# Altium footprint library Package_DFN_QFN.PcbLib: 557 footprints (part 31 of 35)
Each footprint in its own frame and in the unit in brackets; x right, y up, seen from the top. Pads: shape width x height; smd on the part's side, far side on the other; paste and mask are expansions set on the pad; w line width, h text height; cw(c..) or ccw(c..) is an arc to the next point about the centre after c.
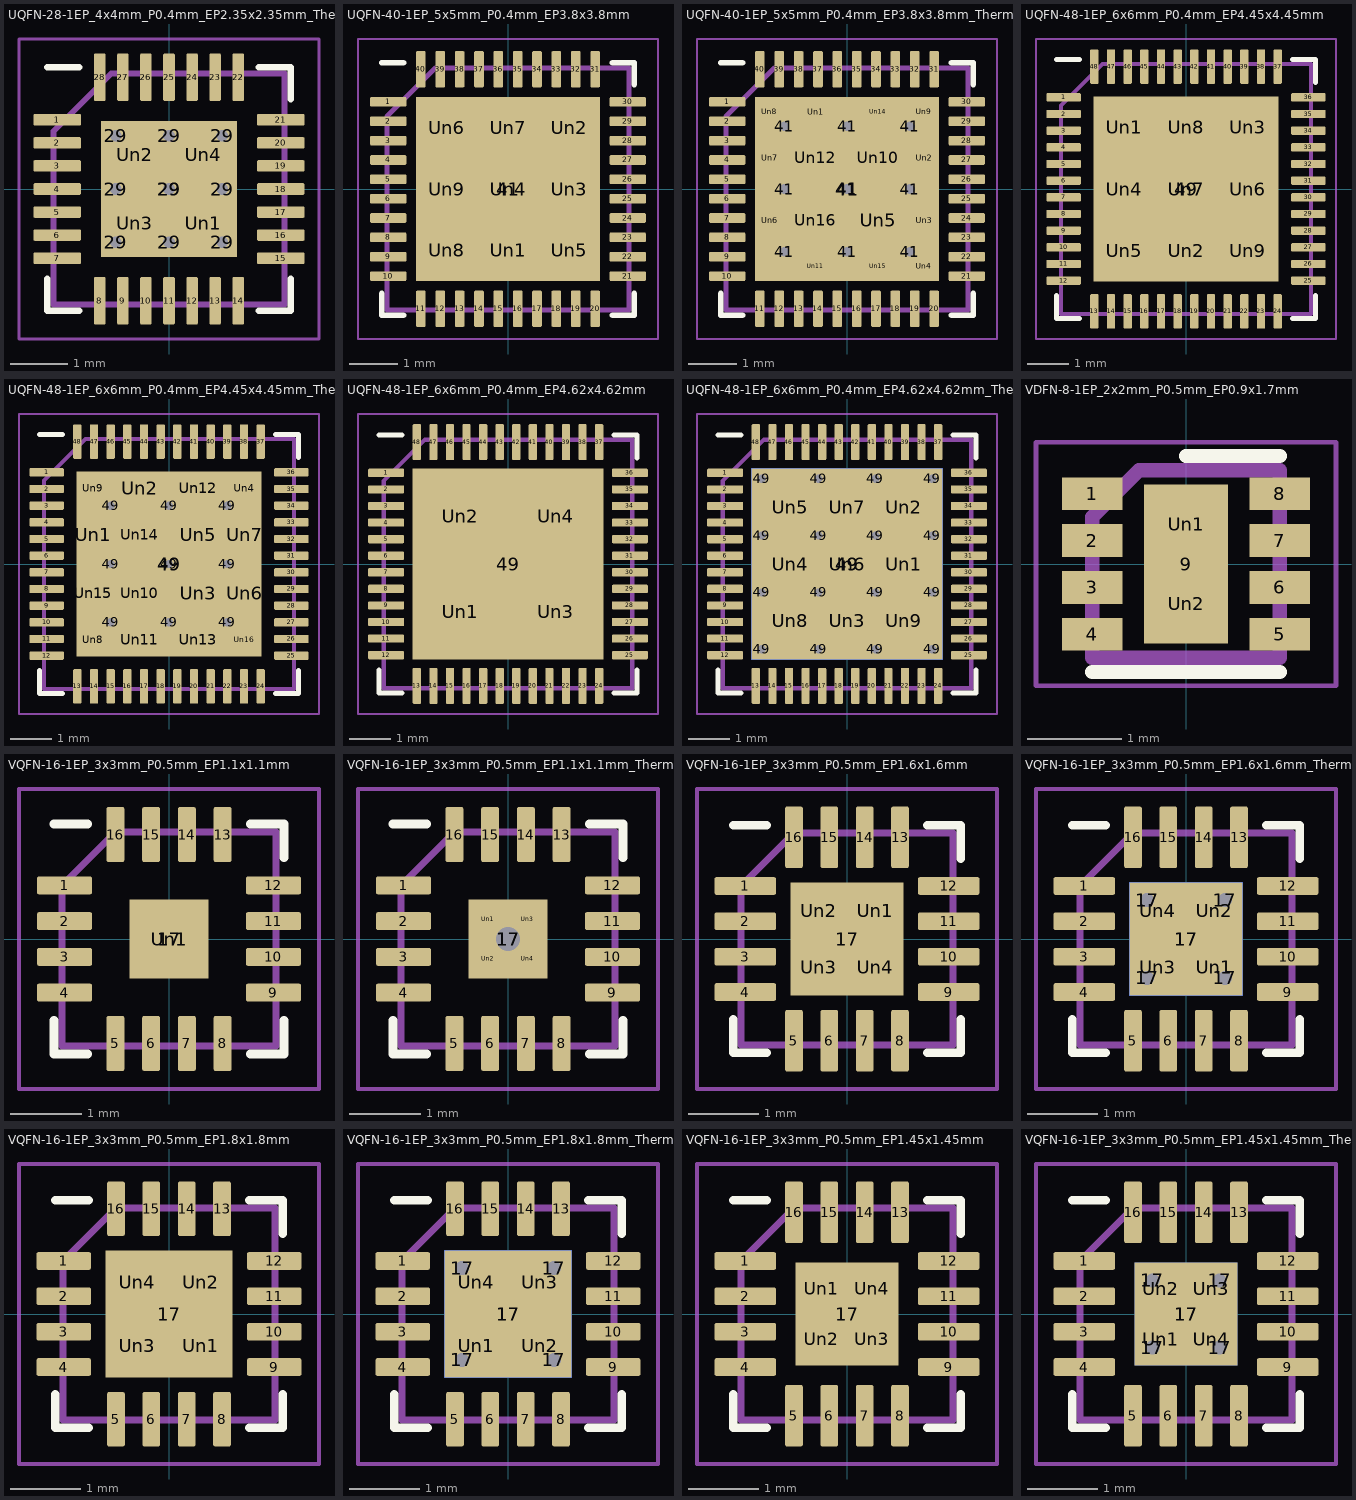
[diagram p30: the footprints below, top view; thin cyan lines are the x and y axes]

## UQFN-28-1EP_4x4mm_P0.4mm_EP2.35x2.35mm_ThermalVias [mm]
pads (43):
  rrect25% 0.825x0.2 smd: 1(-1.937,1.2) 2(-1.937,0.8) 3(-1.937,0.4) 4(-1.937,0) 5(-1.937,-0.4) 6(-1.937,-0.8) 7(-1.937,-1.2) 15(1.937,-1.2) 16(1.937,-0.8) 17(1.937,-0.4) 18(1.937,0) 19(1.937,0.4) 20(1.937,0.8) 21(1.937,1.2)
  rrect25% 0.2x0.825 smd: 8(-1.2,-1.937) 9(-0.8,-1.937) 10(-0.4,-1.937) 11(0,-1.937) 12(0.4,-1.937) 13(0.8,-1.937) 14(1.2,-1.937) 22(1.2,1.937) 23(0.8,1.937) 24(0.4,1.937) 25(0,1.937) 26(-0.4,1.937) 27(-0.8,1.937) 28(-1.2,1.937)
  round 0.5 hole 0.2: 29(-0.925,-0.925) 29(-0.925,0) 29(-0.925,0.925) 29(0,-0.925) 29(0,0) 29(0,0.925) 29(0.925,-0.925) 29(0.925,0) 29(0.925,0.925)
  rect 2.35x2.35 smd far side: 29(0,0)
  rect 2.35x2.35 smd: 29(0,0)
  rrect25% 0.98x0.98 on Top Paste: Un1(0.59,-0.59) Un2(-0.59,0.59) Un3(-0.59,-0.59) Un4(0.59,0.59)
F.SilkS:
  lines w0.12: -2.11,-1.56 -2.11,-2.11 -1.56,-2.11 ; -2.11,2.11 -1.56,2.11 ; 1.56,-2.11 2.11,-2.11 2.11,-1.56 ; 1.56,2.11 2.11,2.11 2.11,1.56
F.CrtYd:
  lines w0.05: -2.6,-2.6 2.6,-2.6 2.6,2.6 -2.6,2.6 -2.6,-2.6
F.Fab:
  lines w0.1: -2,-2 2,-2 2,2 -1,2 -2,1 -2,-2
  text "'.Designator'" at -4.047,-0.84 h1

## UQFN-40-1EP_5x5mm_P0.4mm_EP3.8x3.8mm [mm]
pads (50):
  rrect25% 0.75x0.2 smd: 1(-2.475,1.8) 2(-2.475,1.4) 3(-2.475,1) 4(-2.475,0.6) 5(-2.475,0.2) 6(-2.475,-0.2) 7(-2.475,-0.6) 8(-2.475,-1) 9(-2.475,-1.4) 10(-2.475,-1.8) 21(2.475,-1.8) 22(2.475,-1.4) 23(2.475,-1) 24(2.475,-0.6) 25(2.475,-0.2) 26(2.475,0.2) 27(2.475,0.6) 28(2.475,1) 29(2.475,1.4) 30(2.475,1.8)
  rrect25% 0.2x0.75 smd: 11(-1.8,-2.475) 12(-1.4,-2.475) 13(-1,-2.475) 14(-0.6,-2.475) 15(-0.2,-2.475) 16(0.2,-2.475) 17(0.6,-2.475) 18(1,-2.475) 19(1.4,-2.475) 20(1.8,-2.475) 31(1.8,2.475) 32(1.4,2.475) 33(1,2.475) 34(0.6,2.475) 35(0.2,2.475) 36(-0.2,2.475) 37(-0.6,2.475) 38(-1,2.475) 39(-1.4,2.475) 40(-1.8,2.475)
  rect 3.8x3.8 smd: 41(0,0)
  rrect25% 1.02x1.02 on Top Paste: Un1(0,-1.27) Un2(1.27,1.27) Un3(1.27,0) Un4(0,0) Un5(1.27,-1.27) Un6(-1.27,1.27) Un7(0,1.27) Un8(-1.27,-1.27) Un9(-1.27,0)
F.SilkS:
  lines w0.12: -2.61,-2.16 -2.61,-2.61 -2.16,-2.61 ; -2.61,2.61 -2.16,2.61 ; 2.16,-2.61 2.61,-2.61 2.61,-2.16 ; 2.16,2.61 2.61,2.61 2.61,2.16
F.CrtYd:
  lines w0.05: -3.1,-3.1 -3.1,3.1 3.1,3.1 3.1,-3.1 -3.1,-3.1
F.Fab:
  lines w0.1: -2.5,-2.5 -2.5,1.5 -1.5,2.5 2.5,2.5 2.5,-2.5 -2.5,-2.5
  text "'.Designator'" at -4.047,-0.84 h1

## UQFN-40-1EP_5x5mm_P0.4mm_EP3.8x3.8mm_ThermalVias [mm]
pads (67):
  rrect25% 0.75x0.2 smd: 1(-2.475,1.8) 2(-2.475,1.4) 3(-2.475,1) 4(-2.475,0.6) 5(-2.475,0.2) 6(-2.475,-0.2) 7(-2.475,-0.6) 8(-2.475,-1) 9(-2.475,-1.4) 10(-2.475,-1.8) 21(2.475,-1.8) 22(2.475,-1.4) 23(2.475,-1) 24(2.475,-0.6) 25(2.475,-0.2) 26(2.475,0.2) 27(2.475,0.6) 28(2.475,1) 29(2.475,1.4) 30(2.475,1.8)
  rrect25% 0.2x0.75 smd: 11(-1.8,-2.475) 12(-1.4,-2.475) 13(-1,-2.475) 14(-0.6,-2.475) 15(-0.2,-2.475) 16(0.2,-2.475) 17(0.6,-2.475) 18(1,-2.475) 19(1.4,-2.475) 20(1.8,-2.475) 31(1.8,2.475) 32(1.4,2.475) 33(1,2.475) 34(0.6,2.475) 35(0.2,2.475) 36(-0.2,2.475) 37(-0.6,2.475) 38(-1,2.475) 39(-1.4,2.475) 40(-1.8,2.475)
  round 0.5 hole 0.2: 41(-1.3,-1.3) 41(-1.3,0) 41(-1.3,1.3) 41(0,-1.3) 41(0,0) 41(0,1.3) 41(1.3,-1.3) 41(1.3,0) 41(1.3,1.3)
  rect 3.1x3.1 smd far side: 41(0,0)
  rect 3.8x3.8 smd: 41(0,0)
  round 0.414 on Top Paste: Un1(-0.65,1.6) Un2(1.6,0.65) Un3(1.6,-0.65) Un6(-1.6,-0.65) Un7(-1.6,0.65) Un11(-0.65,-1.6) Un14(0.65,1.6) Un15(0.65,-1.6)
  round 0.366 on Top Paste: Un4(1.6,-1.6) Un8(-1.6,1.6) Un9(1.6,1.6) Un13(-1.6,-1.6)
  rrect24% 1.048x1.048 on Top Paste: Un5(0.65,-0.65) Un10(0.65,0.65) Un12(-0.65,0.65) Un16(-0.65,-0.65)
F.SilkS:
  lines w0.12: -2.61,-2.16 -2.61,-2.61 -2.16,-2.61 ; -2.61,2.61 -2.16,2.61 ; 2.16,-2.61 2.61,-2.61 2.61,-2.16 ; 2.16,2.61 2.61,2.61 2.61,2.16
F.Paste:
  region: -0.196,1.486 -0.254,1.428 -1.046,1.428 -1.104,1.486 -1.104,1.772 -0.196,1.772
  region: 1.772,0.196 1.486,0.196 1.428,0.254 1.428,1.046 1.486,1.104 1.772,1.104
  region: 1.772,-1.104 1.486,-1.104 1.428,-1.046 1.428,-0.254 1.486,-0.196 1.772,-0.196
  region: 1.724,-1.724 1.476,-1.724 1.476,-1.573 1.573,-1.476 1.724,-1.476
  region: -1.428,-0.254 -1.428,-1.046 -1.486,-1.104 -1.772,-1.104 -1.772,-0.196 -1.486,-0.196
  region: -1.428,1.046 -1.428,0.254 -1.486,0.196 -1.772,0.196 -1.772,1.104 -1.486,1.104
  region: -1.476,1.573 -1.573,1.476 -1.724,1.476 -1.724,1.724 -1.476,1.724
  region: 1.724,1.476 1.573,1.476 1.476,1.573 1.476,1.724 1.724,1.724
  region: -0.196,-1.486 -0.196,-1.772 -1.104,-1.772 -1.104,-1.486 -1.046,-1.428 -0.254,-1.428
  region: -1.476,-1.573 -1.476,-1.724 -1.724,-1.724 -1.724,-1.476 -1.573,-1.476
  region: 1.104,1.486 1.046,1.428 0.254,1.428 0.196,1.486 0.196,1.772 1.104,1.772
  region: 1.104,-1.486 1.104,-1.772 0.196,-1.772 0.196,-1.486 0.254,-1.428 1.046,-1.428
F.CrtYd:
  lines w0.05: -3.1,-3.1 -3.1,3.1 3.1,3.1 3.1,-3.1 -3.1,-3.1
F.Fab:
  lines w0.1: -2.5,-2.5 -2.5,1.5 -1.5,2.5 2.5,2.5 2.5,-2.5 -2.5,-2.5
  text "'.Designator'" at -4.047,-0.84 h1

## UQFN-48-1EP_6x6mm_P0.4mm_EP4.45x4.45mm [mm]
pads (58):
  rrect25% 0.825x0.2 smd: 1(-2.937,2.2) 2(-2.937,1.8) 3(-2.937,1.4) 4(-2.937,1) 5(-2.937,0.6) 6(-2.937,0.2) 7(-2.937,-0.2) 8(-2.937,-0.6) 9(-2.937,-1) 10(-2.937,-1.4) 11(-2.937,-1.8) 12(-2.937,-2.2) 25(2.937,-2.2) 26(2.937,-1.8) 27(2.937,-1.4) 28(2.937,-1) 29(2.937,-0.6) 30(2.937,-0.2) 31(2.937,0.2) 32(2.937,0.6) 33(2.937,1) 34(2.937,1.4) 35(2.937,1.8) 36(2.937,2.2)
  rrect25% 0.2x0.825 smd: 13(-2.2,-2.937) 14(-1.8,-2.937) 15(-1.4,-2.937) 16(-1,-2.937) 17(-0.6,-2.937) 18(-0.2,-2.937) 19(0.2,-2.937) 20(0.6,-2.937) 21(1,-2.937) 22(1.4,-2.937) 23(1.8,-2.937) 24(2.2,-2.937) 37(2.2,2.937) 38(1.8,2.937) 39(1.4,2.937) 40(1,2.937) 41(0.6,2.937) 42(0.2,2.937) 43(-0.2,2.937) 44(-0.6,2.937) 45(-1,2.937) 46(-1.4,2.937) 47(-1.8,2.937) 48(-2.2,2.937)
  rect 4.45x4.45 smd: 49(0,0)
  rrect21% 1.2x1.2 on Top Paste: Un1(-1.48,1.48) Un2(0,-1.48) Un3(1.48,1.48) Un4(-1.48,0) Un5(-1.48,-1.48) Un6(1.48,0) Un7(0,0) Un8(0,1.48) Un9(1.48,-1.48)
F.SilkS:
  lines w0.12: -3.11,-2.56 -3.11,-3.11 -2.56,-3.11 ; -3.11,3.11 -2.56,3.11 ; 2.56,-3.11 3.11,-3.11 3.11,-2.56 ; 2.56,3.11 3.11,3.11 3.11,2.56
F.CrtYd:
  lines w0.05: -3.6,-3.6 -3.6,3.6 3.6,3.6 3.6,-3.6 -3.6,-3.6
F.Fab:
  lines w0.1: -3,-3 3,-3 3,3 -2,3 -3,2 -3,-3
  text "'.Designator'" at -4.047,-0.84 h1

## UQFN-48-1EP_6x6mm_P0.4mm_EP4.45x4.45mm_ThermalVias [mm]
pads (75):
  rrect25% 0.825x0.2 smd: 1(-2.937,2.2) 2(-2.937,1.8) 3(-2.937,1.4) 4(-2.937,1) 5(-2.937,0.6) 6(-2.937,0.2) 7(-2.937,-0.2) 8(-2.937,-0.6) 9(-2.937,-1) 10(-2.937,-1.4) 11(-2.937,-1.8) 12(-2.937,-2.2) 25(2.937,-2.2) 26(2.937,-1.8) 27(2.937,-1.4) 28(2.937,-1) 29(2.937,-0.6) 30(2.937,-0.2) 31(2.937,0.2) 32(2.937,0.6) 33(2.937,1) 34(2.937,1.4) 35(2.937,1.8) 36(2.937,2.2)
  rrect25% 0.2x0.825 smd: 13(-2.2,-2.937) 14(-1.8,-2.937) 15(-1.4,-2.937) 16(-1,-2.937) 17(-0.6,-2.937) 18(-0.2,-2.937) 19(0.2,-2.937) 20(0.6,-2.937) 21(1,-2.937) 22(1.4,-2.937) 23(1.8,-2.937) 24(2.2,-2.937) 37(2.2,2.937) 38(1.8,2.937) 39(1.4,2.937) 40(1,2.937) 41(0.6,2.937) 42(0.2,2.937) 43(-0.2,2.937) 44(-0.6,2.937) 45(-1,2.937) 46(-1.4,2.937) 47(-1.8,2.937) 48(-2.2,2.937)
  round 0.5 hole 0.2: 49(-1.4,-1.4) 49(-1.4,0) 49(-1.4,1.4) 49(0,-1.4) 49(0,0) 49(0,1.4) 49(1.4,-1.4) 49(1.4,0) 49(1.4,1.4)
  rect 4.45x4.45 smd: 49(0,0)
  rect 3.3x3.3 smd far side: 49(0,0)
  rrect25% 0.665x1.129 on Top Paste: Un1(-1.813,0.7) Un6(1.813,-0.7) Un7(1.813,0.7) Un15(-1.813,-0.7)
  rrect25% 1.129x0.665 on Top Paste: Un2(-0.7,1.813) Un11(-0.7,-1.813) Un12(0.7,1.813) Un13(0.7,-1.813)
  rrect22% 1.129x1.129 on Top Paste: Un3(0.7,-0.7) Un5(0.7,0.7) Un10(-0.7,-0.7) Un14(-0.7,0.7)
  round 0.578 on Top Paste: Un4(1.813,1.813) Un8(-1.813,-1.813) Un9(-1.813,1.813) Un16(1.813,-1.813)
F.SilkS:
  lines w0.12: -3.11,-2.56 -3.11,-3.11 -2.56,-3.11 ; -3.11,3.11 -2.56,3.11 ; 2.56,-3.11 3.11,-3.11 3.11,-2.56 ; 2.56,3.11 3.11,3.11 3.11,2.56
F.Paste:
  region: 2.058,1.567 1.639,1.567 1.567,1.639 1.567,2.058 2.058,2.058
  region: -1.567,-1.639 -1.567,-2.058 -2.058,-2.058 -2.058,-1.567 -1.639,-1.567
  region: -1.567,1.639 -1.639,1.567 -2.058,1.567 -2.058,2.058 -1.567,2.058
  region: 2.058,-2.058 1.567,-2.058 1.567,-1.639 1.639,-1.567 2.058,-1.567
F.CrtYd:
  lines w0.05: -3.6,-3.6 -3.6,3.6 3.6,3.6 3.6,-3.6 -3.6,-3.6
F.Fab:
  lines w0.1: -3,-3 -3,2 -2,3 3,3 3,-3 -3,-3
  text "'.Designator'" at -4.047,-0.84 h1

## UQFN-48-1EP_6x6mm_P0.4mm_EP4.62x4.62mm [mm]
pads (53):
  rrect25% 0.865x0.2 smd: 1(-2.943,2.2) 2(-2.943,1.8) 3(-2.943,1.4) 4(-2.943,1) 5(-2.943,0.6) 6(-2.943,0.2) 7(-2.943,-0.2) 8(-2.943,-0.6) 9(-2.943,-1) 10(-2.943,-1.4) 11(-2.943,-1.8) 12(-2.943,-2.2) 25(2.943,-2.2) 26(2.943,-1.8) 27(2.943,-1.4) 28(2.943,-1) 29(2.943,-0.6) 30(2.943,-0.2) 31(2.943,0.2) 32(2.943,0.6) 33(2.943,1) 34(2.943,1.4) 35(2.943,1.8) 36(2.943,2.2)
  rrect25% 0.2x0.865 smd: 13(-2.2,-2.943) 14(-1.8,-2.943) 15(-1.4,-2.943) 16(-1,-2.943) 17(-0.6,-2.943) 18(-0.2,-2.943) 19(0.2,-2.943) 20(0.6,-2.943) 21(1,-2.943) 22(1.4,-2.943) 23(1.8,-2.943) 24(2.2,-2.943) 37(2.2,2.943) 38(1.8,2.943) 39(1.4,2.943) 40(1,2.943) 41(0.6,2.943) 42(0.2,2.943) 43(-0.2,2.943) 44(-0.6,2.943) 45(-1,2.943) 46(-1.4,2.943) 47(-1.8,2.943) 48(-2.2,2.943)
  rect 4.62x4.62 smd: 49(0,0)
  rrect13% 1.86x1.86 on Top Paste: Un1(-1.155,-1.155) Un2(-1.155,1.155) Un3(1.155,-1.155) Un4(1.155,1.155)
F.SilkS:
  lines w0.12: -3.11,-2.56 -3.11,-3.11 -2.56,-3.11 ; -3.11,3.11 -2.56,3.11 ; 2.56,-3.11 3.11,-3.11 3.11,-2.56 ; 2.56,3.11 3.11,3.11 3.11,2.56
F.CrtYd:
  lines w0.05: -3.62,-3.62 3.62,-3.62 3.62,3.62 -3.62,3.62 -3.62,-3.62
F.Fab:
  lines w0.1: -3,-3 3,-3 3,3 -2,3 -3,2 -3,-3
  text "'.Designator'" at -4.047,-0.84 h1

## UQFN-48-1EP_6x6mm_P0.4mm_EP4.62x4.62mm_ThermalVias [mm]
pads (75):
  rrect25% 0.865x0.2 smd: 1(-2.943,2.2) 2(-2.943,1.8) 3(-2.943,1.4) 4(-2.943,1) 5(-2.943,0.6) 6(-2.943,0.2) 7(-2.943,-0.2) 8(-2.943,-0.6) 9(-2.943,-1) 10(-2.943,-1.4) 11(-2.943,-1.8) 12(-2.943,-2.2) 25(2.943,-2.2) 26(2.943,-1.8) 27(2.943,-1.4) 28(2.943,-1) 29(2.943,-0.6) 30(2.943,-0.2) 31(2.943,0.2) 32(2.943,0.6) 33(2.943,1) 34(2.943,1.4) 35(2.943,1.8) 36(2.943,2.2)
  rrect25% 0.2x0.865 smd: 13(-2.2,-2.943) 14(-1.8,-2.943) 15(-1.4,-2.943) 16(-1,-2.943) 17(-0.6,-2.943) 18(-0.2,-2.943) 19(0.2,-2.943) 20(0.6,-2.943) 21(1,-2.943) 22(1.4,-2.943) 23(1.8,-2.943) 24(2.2,-2.943) 37(2.2,2.943) 38(1.8,2.943) 39(1.4,2.943) 40(1,2.943) 41(0.6,2.943) 42(0.2,2.943) 43(-0.2,2.943) 44(-0.6,2.943) 45(-1,2.943) 46(-1.4,2.943) 47(-1.8,2.943) 48(-2.2,2.943)
  round 0.5 hole 0.2: 49(-2.06,-2.06) 49(-2.06,-0.687) 49(-2.06,0.687) 49(-2.06,2.06) 49(-0.687,-2.06) 49(-0.687,-0.687) 49(-0.687,0.687) 49(-0.687,2.06) 49(0.687,-2.06) 49(0.687,-0.687) 49(0.687,0.687) 49(0.687,2.06) 49(2.06,-2.06) 49(2.06,-0.687) 49(2.06,0.687) 49(2.06,2.06)
  rect 4.62x4.62 smd: 49(0,0)
  rect 4.62x4.62 smd far side: 49(0,0)
  rrect21% 1.193x1.193 on Top Paste: Un1(1.373,0) Un2(1.373,1.373) Un3(0,-1.373) Un4(-1.373,0) Un5(-1.373,1.373) Un6(0,0) Un7(0,1.373) Un8(-1.373,-1.373) Un9(1.373,-1.373)
F.SilkS:
  lines w0.12: -3.11,-2.56 -3.11,-3.11 -2.56,-3.11 ; -3.11,3.11 -2.56,3.11 ; 2.56,-3.11 3.11,-3.11 3.11,-2.56 ; 2.56,3.11 3.11,3.11 3.11,2.56
F.CrtYd:
  lines w0.05: -3.62,-3.62 3.62,-3.62 3.62,3.62 -3.62,3.62 -3.62,-3.62
F.Fab:
  lines w0.1: -3,-3 3,-3 3,3 -2,3 -3,2 -3,-3
  text "'.Designator'" at -4.047,-0.84 h1

## VDFN-8-1EP_2x2mm_P0.5mm_EP0.9x1.7mm [mm]
pads (11):
  rect 0.65x0.35 smd: 1(-1,0.75) 2(-1,0.25) 3(-1,-0.25) 4(-1,-0.75) 5(1,-0.75) 6(1,-0.25) 7(1,0.25) 8(1,0.75)
  rect 0.9x1.7 smd: 9(0,0)
  rect 0.72x0.69 on Top Paste: Un1(0,0.425) Un2(0,-0.425)
F.SilkS:
  lines w0.15: -1,-1.15 1,-1.15 ; 0,1.15 1,1.15
F.CrtYd:
  lines w0.05: -1.6,-1.3 -1.6,1.3 1.6,1.3 1.6,-1.3 -1.6,-1.3
F.Fab:
  lines w0.15: -1,-1 -1,0.5 -0.5,1 1,1 1,-1 -1,-1
  text "'.Designator'" at -2.023,-0.42 h0.5

## VQFN-16-1EP_3x3mm_P0.5mm_EP1.1x1.1mm [mm]
pads (18):
  rrect25% 0.775x0.25 smd: 1(-1.462,0.75) 2(-1.462,0.25) 3(-1.462,-0.25) 4(-1.462,-0.75) 9(1.462,-0.75) 10(1.462,-0.25) 11(1.462,0.25) 12(1.462,0.75)
  rrect25% 0.25x0.775 smd: 5(-0.75,-1.462) 6(-0.25,-1.462) 7(0.25,-1.462) 8(0.75,-1.462) 13(0.75,1.462) 14(0.25,1.462) 15(-0.25,1.462) 16(-0.75,1.462)
  rect 1.1x1.1 smd: 17(0,0)
  rrect25% 0.89x0.89 on Top Paste: Un1(0,0)
F.SilkS:
  lines w0.12: -1.61,-1.135 -1.61,-1.61 -1.135,-1.61 ; -1.61,1.61 -1.135,1.61 ; 1.135,-1.61 1.61,-1.61 1.61,-1.135 ; 1.135,1.61 1.61,1.61 1.61,1.135
F.CrtYd:
  lines w0.05: -2.1,-2.1 -2.1,2.1 2.1,2.1 2.1,-2.1 -2.1,-2.1
F.Fab:
  lines w0.1: -1.5,-1.5 1.5,-1.5 1.5,1.5 -0.75,1.5 -1.5,0.75 -1.5,-1.5
  text "'.Designator'" at -3.033,-0.628 h0.75

## VQFN-16-1EP_3x3mm_P0.5mm_EP1.1x1.1mm_ThermalVias [mm]
pads (23):
  rrect25% 0.775x0.25 smd: 1(-1.462,0.75) 2(-1.462,0.25) 3(-1.462,-0.25) 4(-1.462,-0.75) 9(1.462,-0.75) 10(1.462,-0.25) 11(1.462,0.25) 12(1.462,0.75)
  rrect25% 0.25x0.775 smd: 5(-0.75,-1.462) 6(-0.25,-1.462) 7(0.25,-1.462) 8(0.75,-1.462) 13(0.75,1.462) 14(0.25,1.462) 15(-0.25,1.462) 16(-0.75,1.462)
  rect 1.1x1.1 smd: 17(0,0)
  round 0.63 hole 0.33: 17(0,0)
  rect 0.63x0.63 smd far side: 17(0,0)
  round 0.204 on Top Paste: Un1(-0.275,0.275) Un2(-0.275,-0.275) Un3(0.275,0.275) Un4(0.275,-0.275)
F.SilkS:
  lines w0.12: -1.61,-1.135 -1.61,-1.61 -1.135,-1.61 ; -1.61,1.61 -1.135,1.61 ; 1.135,-1.61 1.61,-1.61 1.61,-1.135 ; 1.135,1.61 1.61,1.61 1.61,1.135
F.Paste:
  region: -0.106,0.414 -0.414,0.106 -0.444,0.106 -0.444,0.444 -0.106,0.444
  region: -0.106,-0.414 -0.106,-0.444 -0.444,-0.444 -0.444,-0.106 -0.414,-0.106
  region: 0.444,0.106 0.414,0.106 0.106,0.414 0.106,0.444 0.444,0.444
  region: 0.444,-0.444 0.106,-0.444 0.106,-0.414 0.414,-0.106 0.444,-0.106
F.CrtYd:
  lines w0.05: -2.1,-2.1 -2.1,2.1 2.1,2.1 2.1,-2.1 -2.1,-2.1
F.Fab:
  lines w0.1: -1.5,-1.5 1.5,-1.5 1.5,1.5 -0.75,1.5 -1.5,0.75 -1.5,-1.5
  text "'.Designator'" at -3.033,-0.628 h0.75

## VQFN-16-1EP_3x3mm_P0.5mm_EP1.6x1.6mm [mm]
pads (21):
  rrect25% 0.875x0.25 smd: 1(-1.438,0.75) 2(-1.438,0.25) 3(-1.438,-0.25) 4(-1.438,-0.75) 9(1.438,-0.75) 10(1.438,-0.25) 11(1.438,0.25) 12(1.438,0.75)
  rrect25% 0.25x0.875 smd: 5(-0.75,-1.438) 6(-0.25,-1.438) 7(0.25,-1.438) 8(0.75,-1.438) 13(0.75,1.438) 14(0.25,1.438) 15(-0.25,1.438) 16(-0.75,1.438)
  rect 1.6x1.6 smd: 17(0,0)
  rrect25% 0.64x0.64 on Top Paste: Un1(0.4,0.4) Un2(-0.4,0.4) Un3(-0.4,-0.4) Un4(0.4,-0.4)
F.SilkS:
  lines w0.12: -1.61,-1.135 -1.61,-1.61 -1.135,-1.61 ; -1.61,1.61 -1.135,1.61 ; 1.135,-1.61 1.61,-1.61 1.61,-1.135 ; 1.135,1.61 1.61,1.61 1.61,1.135
F.CrtYd:
  lines w0.05: -2.12,-2.12 -2.12,2.12 2.12,2.12 2.12,-2.12 -2.12,-2.12
F.Fab:
  lines w0.1: -1.5,-1.5 -1.5,0.75 -0.75,1.5 1.5,1.5 1.5,-1.5 -1.5,-1.5
  text "'.Designator'" at -3.033,-0.628 h0.75

## VQFN-16-1EP_3x3mm_P0.5mm_EP1.6x1.6mm_ThermalVias [mm]
pads (26):
  rrect25% 0.875x0.25 smd: 1(-1.438,0.75) 2(-1.438,0.25) 3(-1.438,-0.25) 4(-1.438,-0.75) 9(1.438,-0.75) 10(1.438,-0.25) 11(1.438,0.25) 12(1.438,0.75)
  rrect25% 0.25x0.875 smd: 5(-0.75,-1.438) 6(-0.25,-1.438) 7(0.25,-1.438) 8(0.75,-1.438) 13(0.75,1.438) 14(0.25,1.438) 15(-0.25,1.438) 16(-0.75,1.438)
  round 0.5 hole 0.2: 17(-0.55,-0.55) 17(-0.55,0.55) 17(0.55,-0.55) 17(0.55,0.55)
  rect 1.6x1.6 smd far side: 17(0,0)
  rect 1.6x1.6 smd: 17(0,0)
  rrect25% 0.69x0.69 on Top Paste: Un1(0.4,-0.4) Un2(0.4,0.4) Un3(-0.4,-0.4) Un4(-0.4,0.4)
F.SilkS:
  lines w0.12: -1.61,-1.135 -1.61,-1.61 -1.135,-1.61 ; -1.61,1.61 -1.135,1.61 ; 1.135,-1.61 1.61,-1.61 1.61,-1.135 ; 1.135,1.61 1.61,1.61 1.61,1.135
F.CrtYd:
  lines w0.05: -2.12,-2.12 2.12,-2.12 2.12,2.12 -2.12,2.12 -2.12,-2.12
F.Fab:
  lines w0.1: -1.5,-1.5 1.5,-1.5 1.5,1.5 -0.75,1.5 -1.5,0.75 -1.5,-1.5
  text "'.Designator'" at -3.033,-0.628 h0.75

## VQFN-16-1EP_3x3mm_P0.5mm_EP1.8x1.8mm [mm]
pads (21):
  rrect25% 0.775x0.25 smd: 1(-1.488,0.75) 2(-1.488,0.25) 3(-1.488,-0.25) 4(-1.488,-0.75) 9(1.488,-0.75) 10(1.488,-0.25) 11(1.488,0.25) 12(1.488,0.75)
  rrect25% 0.25x0.775 smd: 5(-0.75,-1.488) 6(-0.25,-1.488) 7(0.25,-1.488) 8(0.75,-1.488) 13(0.75,1.488) 14(0.25,1.488) 15(-0.25,1.488) 16(-0.75,1.488)
  rect 1.8x1.8 smd: 17(0,0)
  rrect25% 0.73x0.73 on Top Paste: Un1(0.45,-0.45) Un2(0.45,0.45) Un3(-0.45,-0.45) Un4(-0.45,0.45)
F.SilkS:
  lines w0.12: -1.61,-1.135 -1.61,-1.61 -1.135,-1.61 ; -1.61,1.61 -1.135,1.61 ; 1.135,-1.61 1.61,-1.61 1.61,-1.135 ; 1.135,1.61 1.61,1.61 1.61,1.135
F.CrtYd:
  lines w0.05: -2.12,-2.12 -2.12,2.12 2.12,2.12 2.12,-2.12 -2.12,-2.12
F.Fab:
  lines w0.1: -1.5,-1.5 -1.5,0.75 -0.75,1.5 1.5,1.5 1.5,-1.5 -1.5,-1.5
  text "'.Designator'" at -3.033,-0.628 h0.75

## VQFN-16-1EP_3x3mm_P0.5mm_EP1.8x1.8mm_ThermalVias [mm]
pads (26):
  rrect25% 0.775x0.25 smd: 1(-1.488,0.75) 2(-1.488,0.25) 3(-1.488,-0.25) 4(-1.488,-0.75) 9(1.488,-0.75) 10(1.488,-0.25) 11(1.488,0.25) 12(1.488,0.75)
  rrect25% 0.25x0.775 smd: 5(-0.75,-1.488) 6(-0.25,-1.488) 7(0.25,-1.488) 8(0.75,-1.488) 13(0.75,1.488) 14(0.25,1.488) 15(-0.25,1.488) 16(-0.75,1.488)
  round 0.5 hole 0.2: 17(-0.65,-0.65) 17(-0.65,0.65) 17(0.65,-0.65) 17(0.65,0.65)
  rect 1.8x1.8 smd: 17(0,0)
  rect 1.8x1.8 smd far side: 17(0,0)
  rrect25% 0.78x0.78 on Top Paste: Un1(-0.45,-0.45) Un2(0.45,-0.45) Un3(0.45,0.45) Un4(-0.45,0.45)
F.SilkS:
  lines w0.12: -1.61,-1.135 -1.61,-1.61 -1.135,-1.61 ; -1.61,1.61 -1.135,1.61 ; 1.135,-1.61 1.61,-1.61 1.61,-1.135 ; 1.135,1.61 1.61,1.61 1.61,1.135
F.CrtYd:
  lines w0.05: -2.12,-2.12 -2.12,2.12 2.12,2.12 2.12,-2.12 -2.12,-2.12
F.Fab:
  lines w0.1: -1.5,-1.5 -1.5,0.75 -0.75,1.5 1.5,1.5 1.5,-1.5 -1.5,-1.5
  text "'.Designator'" at -3.033,-0.628 h0.75

## VQFN-16-1EP_3x3mm_P0.5mm_EP1.45x1.45mm [mm]
pads (21):
  rrect25% 0.875x0.25 smd: 1(-1.438,0.75) 2(-1.438,0.25) 3(-1.438,-0.25) 4(-1.438,-0.75) 9(1.438,-0.75) 10(1.438,-0.25) 11(1.438,0.25) 12(1.438,0.75)
  rrect25% 0.25x0.875 smd: 5(-0.75,-1.438) 6(-0.25,-1.438) 7(0.25,-1.438) 8(0.75,-1.438) 13(0.75,1.438) 14(0.25,1.438) 15(-0.25,1.438) 16(-0.75,1.438)
  rect 1.45x1.45 smd: 17(0,0)
  rrect25% 0.58x0.58 on Top Paste: Un1(-0.36,0.36) Un2(-0.36,-0.36) Un3(0.36,-0.36) Un4(0.36,0.36)
F.SilkS:
  lines w0.12: -1.61,-1.135 -1.61,-1.61 -1.135,-1.61 ; -1.61,1.61 -1.135,1.61 ; 1.135,-1.61 1.61,-1.61 1.61,-1.135 ; 1.135,1.61 1.61,1.61 1.61,1.135
F.CrtYd:
  lines w0.05: -2.12,-2.12 2.12,-2.12 2.12,2.12 -2.12,2.12 -2.12,-2.12
F.Fab:
  lines w0.1: -1.5,-1.5 -1.5,0.75 -0.75,1.5 1.5,1.5 1.5,-1.5 -1.5,-1.5
  text "'.Designator'" at -3.033,-0.628 h0.75

## VQFN-16-1EP_3x3mm_P0.5mm_EP1.45x1.45mm_ThermalVias [mm]
pads (26):
  rrect25% 0.875x0.25 smd: 1(-1.438,0.75) 2(-1.438,0.25) 3(-1.438,-0.25) 4(-1.438,-0.75) 9(1.438,-0.75) 10(1.438,-0.25) 11(1.438,0.25) 12(1.438,0.75)
  rrect25% 0.25x0.875 smd: 5(-0.75,-1.438) 6(-0.25,-1.438) 7(0.25,-1.438) 8(0.75,-1.438) 13(0.75,1.438) 14(0.25,1.438) 15(-0.25,1.438) 16(-0.75,1.438)
  round 0.5 hole 0.2: 17(-0.475,-0.475) 17(-0.475,0.475) 17(0.475,-0.475) 17(0.475,0.475)
  rect 1.45x1.45 smd far side: 17(0,0)
  rect 1.45x1.45 smd: 17(0,0)
  rrect25% 0.63x0.63 on Top Paste: Un1(-0.36,-0.36) Un2(-0.36,0.36) Un3(0.36,0.36) Un4(0.36,-0.36)
F.SilkS:
  lines w0.12: -1.61,-1.135 -1.61,-1.61 -1.135,-1.61 ; -1.61,1.61 -1.135,1.61 ; 1.135,-1.61 1.61,-1.61 1.61,-1.135 ; 1.135,1.61 1.61,1.61 1.61,1.135
F.CrtYd:
  lines w0.05: -2.12,-2.12 2.12,-2.12 2.12,2.12 -2.12,2.12 -2.12,-2.12
F.Fab:
  lines w0.1: -1.5,-1.5 -1.5,0.75 -0.75,1.5 1.5,1.5 1.5,-1.5 -1.5,-1.5
  text "'.Designator'" at -3.033,-0.628 h0.75